# Altium footprint library Revo_connector_kisun.PcbLib: 90 footprints (part 3 of 6)
Each footprint in its own frame and in the unit in brackets; x right, y up, seen from the top. Pads: shape width x height; smd on the part's side, far side on the other; paste and mask are expansions set on the pad; w line width, h text height; cw(c..) or ccw(c..) is an arc to the next point about the centre after c.
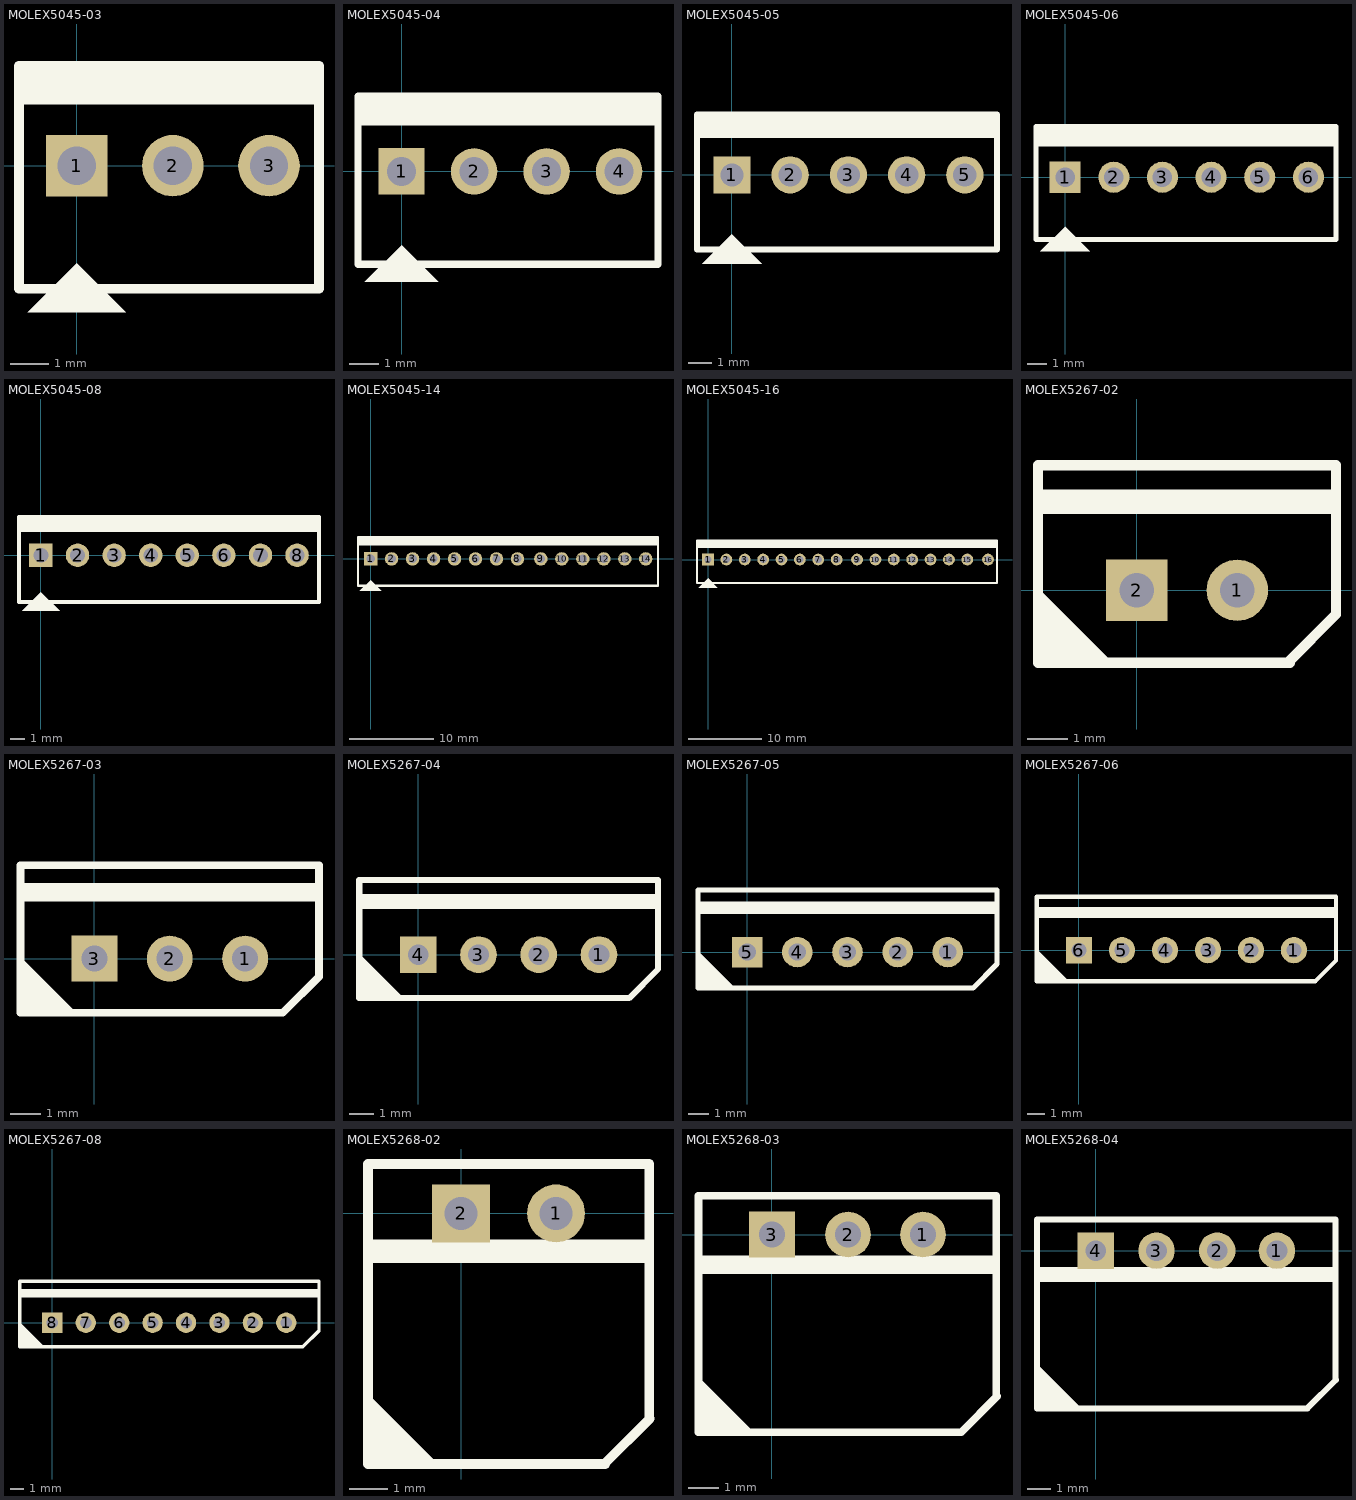
[diagram p2: the footprints below, top view; thin cyan lines are the x and y axes]

## MOLEX5045-03 [mm]
pads (3):
  rect 1.6x1.6 hole 1: 1(0,0)
  round 1.6 hole 1: 2(2.5,0) 3(5,0)
Top Overlay:
  region: 0,-2.54 -1.27,-3.81 1.27,-3.81
  region: -1.4,1.6 6.22,1.6 6.22,2.6 -1.4,2.6
  lines w0.254: -1.5,-3.2 -1.5,2.6 6.22,2.6 ; -1.48,-3.2 6.22,-3.2 ; 6.3,-3.2 6.3,2.6

## MOLEX5045-04 [mm]
pads (4):
  rect 1.6x1.6 hole 1: 1(0,0)
  round 1.6 hole 1: 2(2.5,0) 3(5,0) 4(7.5,0)
Top Overlay:
  region: 0,-2.54 -1.27,-3.81 1.27,-3.81
  region: -1.4,1.6 8.82,1.6 8.82,2.6 -1.4,2.6
  lines w0.254: -1.5,-3.2 -1.5,2.6 8.82,2.6 ; -1.48,-3.2 8.82,-3.2 ; 8.84,-3.2 8.84,2.6

## MOLEX5045-05 [mm]
pads (5):
  rect 1.6x1.6 hole 1: 1(0,0)
  round 1.6 hole 1: 2(2.5,0) 3(5,0) 4(7.5,0) 5(10,0)
Top Overlay:
  region: 0,-2.54 -1.27,-3.81 1.27,-3.81
  region: -1.4,1.6 11.32,1.6 11.32,2.6 -1.4,2.6
  lines w0.254: -1.5,-3.2 -1.5,2.6 11.32,2.6 ; -1.48,-3.2 11.32,-3.2 ; 11.38,-3.2 11.38,2.6

## MOLEX5045-06 [mm]
pads (6):
  rect 1.6x1.6 hole 1: 1(0,0)
  round 1.6 hole 1: 2(2.5,0) 3(5,0) 4(7.5,0) 5(10,0) 6(12.5,0)
Top Overlay:
  region: -1.4,1.6 13.92,1.6 13.92,2.6 -1.4,2.6
  region: 0,-2.54 -1.27,-3.81 1.27,-3.81
  lines w0.254: -1.5,-3.2 13.92,-3.2 13.92,2.6 -1.5,2.6 -1.5,-3.2

## MOLEX5045-08 [mm]
pads (8):
  rect 1.6x1.6 hole 1: 1(0,0)
  round 1.6 hole 1: 2(2.5,0) 3(5,0) 4(7.5,0) 5(10,0) 6(12.5,0) 7(15,0) 8(17.5,0)
Top Overlay:
  region: -1.4,1.6 19,1.6 19,2.6 -1.4,2.6
  region: 0,-2.54 -1.27,-3.81 1.27,-3.81
  lines w0.254: -1.5,-3.2 19,-3.2 19,2.6 -1.5,2.6 -1.5,-3.2

## MOLEX5045-14 [mm]
pads (14):
  rect 1.6x1.6 hole 1: 1(0,0)
  round 1.6 hole 1: 2(2.5,0) 3(5,0) 4(7.5,0) 5(10,0) 6(12.5,0) 7(15,0) 8(17.5,0) 9(20.28,0) 10(22.78,0) 11(25.28,0) 12(27.78,0) 13(30.28,0) 14(32.78,0)
Top Overlay:
  region: 13.84,1.6 34.24,1.6 34.24,2.6 13.84,2.6
  region: -1.4,1.6 19,1.6 19,2.6 -1.4,2.6
  region: 0,-2.54 -1.27,-3.81 1.27,-3.81
  lines w0.254: -1.5,-3.2 34.24,-3.2 34.24,2.6 -1.5,2.6 -1.5,-3.2

## MOLEX5045-16 [mm]
pads (16):
  rect 1.6x1.6 hole 1: 1(0,0)
  round 1.6 hole 1: 2(2.5,0) 3(5,0) 4(7.5,0) 5(10,0) 6(12.5,0) 7(15,0) 8(17.5,0) 9(20.28,0) 10(22.78,0) 11(25.28,0) 12(27.78,0) 13(30.28,0) 14(32.78,0) 15(35.28,0) 16(38.1,0)
Top Overlay:
  region: -1.4,1.6 19,1.6 19,2.6 -1.4,2.6
  region: 18.92,1.6 39.32,1.6 39.32,2.6 18.92,2.6
  region: 0,-2.54 -1.27,-3.81 1.27,-3.81
  lines w0.254: -1.5,-3.2 39.32,-3.2 39.32,2.6 -1.5,2.6 -1.5,-3.2

## MOLEX5267-02 [mil]
pads (2):
  round 60 hole 34: 1(98.43,0)
  rect 60x60 hole 34: 2(0,0)
Top Overlay:
  region: -94.49,-70.87 -23.62,-70.87 -94.49,0
  region: -98.43,74.8 192.91,74.8 192.91,98.43 -98.43,98.43
  lines w10: -96.46,-70.87 -96.46,122.05 192.91,122.05 ; -94.49,-70.87 149.61,-70.87 ; 147.64,-70.87 194.88,-23.62 194.88,122.05
3D body "022035025.stp": height 234.25, standoff -135.83, extent -96.45,-75.98 194.89,116.93

## MOLEX5267-03 [mil]
pads (3):
  round 60 hole 34: 1(196.85,0) 2(98.43,0)
  rect 60x60 hole 34: 3(0,0)
Top Overlay:
  region: -94.49,-70.87 -23.62,-70.87 -94.49,0
  region: -98.43,74.8 291.34,74.8 291.34,98.43 -98.43,98.43
  lines w10: -96.46,-70.87 -96.46,122.05 291.34,122.05 ; -94.49,-70.87 244.09,-70.87 ; 246.06,-70.87 293.31,-23.62 293.31,122.05
3D body "022035035.stp": height 234.25, standoff -135.83, extent -96.45,-75.98 293.32,116.93

## MOLEX5267-04 [mil]
pads (4):
  round 60 hole 34: 1(295.28,0) 2(196.85,0) 3(98.43,0)
  rect 60x60 hole 34: 4(0,0)
Top Overlay:
  region: -94.49,-70.87 -23.62,-70.87 -94.49,0
  region: -98.43,74.8 389.76,74.8 389.76,98.43 -98.43,98.43
  lines w10: -96.46,-70.87 -96.46,122.05 389.76,122.05 ; -93.7,-70.87 342.52,-70.87 ; 344.49,-70.87 391.73,-23.62 391.73,122.05
3D body "022035045.stp": height 234.25, standoff -135.83, extent -96.46,-66.14 391.73,126.77

## MOLEX5267-05 [mil]
pads (5):
  round 60 hole 34: 1(393.7,0) 2(295.28,0) 3(196.85,0) 4(98.43,0)
  rect 60x60 hole 34: 5(0,0)
Top Overlay:
  region: -94.49,-70.87 -23.62,-70.87 -94.49,0
  region: -98.43,74.8 488.19,74.8 488.19,98.43 -98.43,98.43
  lines w10: -96.46,-70.87 -96.46,122.05 488.19,122.05 ; -93.7,-70.87 440.94,-70.87 ; 442.91,-70.87 490.16,-23.62 490.16,122.05
3D body "022035055.stp": height 234.25, standoff -135.83, extent -96.46,-68.9 490.16,124.02

## MOLEX5267-06 [mil]
pads (6):
  round 60 hole 34: 1(492.13,0) 2(393.7,0) 3(295.28,0) 4(196.85,0) 5(98.43,0)
  rect 60x60 hole 34: 6(0,0)
Top Overlay:
  region: -94.49,-70.87 -23.62,-70.87 -94.49,0
  region: -98.43,74.8 586.61,74.8 586.61,98.43 -98.43,98.43
  lines w10: -96.46,-70.87 -96.46,122.05 586.61,122.05 ; -93.7,-70.87 539.37,-70.87 ; 541.34,-70.87 588.58,-23.62 588.58,122.05
3D body "022035065.stp": height 234.25, standoff -135.83, extent -96.46,-71.07 588.58,121.85

## MOLEX5267-08 [mil]
pads (8):
  round 60 hole 34: 1(688.98,0) 2(590.55,0) 3(492.13,0) 4(393.7,0) 5(295.28,0) 6(196.85,0) 7(98.43,0)
  rect 60x60 hole 34: 8(0,0)
Top Overlay:
  region: -94.49,-70.87 -23.62,-70.87 -94.49,0
  region: -98.43,74.8 783.46,74.8 783.46,98.43 -98.43,98.43
  lines w10: -96.46,-70.87 -96.46,122.05 785.43,122.05 785.43,-23.62 738.19,-70.87 -96.46,-70.87
3D body "022035085.stp": height 234.25, standoff -135.83, extent -98.43,-66.93 783.46,125.99

## MOLEX5268-02 [mil]
pads (2):
  round 60 hole 34: 1(98.43,0)
  rect 60x60 hole 34: 2(0,0)
Top Overlay:
  region: -94.49,-259.84 -23.62,-259.84 -94.49,-188.98
  region: -98.43,-51.18 192.91,-51.18 192.91,-27.56 -98.43,-27.56
  lines w10: -96.46,-259.84 -96.46,51.18 192.91,51.18 ; -94.49,-259.84 149.61,-259.84 ; 148.43,-259.84 195.67,-212.6 ; 194.88,-212.6 194.88,51.18

## MOLEX5268-03 [mil]
pads (3):
  round 60 hole 34: 1(198.43,0) 2(100,0)
  rect 60x60 hole 34: 3(0,0)
Top Overlay:
  region: -94.49,-259.84 -23.62,-259.84 -94.49,-188.98
  region: 1.57,-51.18 292.91,-51.18 292.91,-27.56 1.57,-27.56
  region: -98.43,-51.18 192.91,-51.18 192.91,-27.56 -98.43,-27.56
  lines w10: -96.46,-259.84 -96.46,51.18 294.88,51.18 294.88,-212.6 ; -94.49,-259.84 248.43,-259.84 295.67,-212.6
3D body "22057035.stp": height 194.88, standoff -135.83, extent -97.64,-260.63 292.13,50.4

## MOLEX5268-04 [mil]
pads (4):
  round 60 hole 34: 1(298.43,0) 2(200,0) 3(100,0)
  rect 60x60 hole 34: 4(0,0)
Top Overlay:
  region: -94.49,-259.84 -23.62,-259.84 -94.49,-188.98
  region: -98.43,-51.18 192.91,-51.18 192.91,-27.56 -98.43,-27.56
  region: 101.57,-51.18 392.91,-51.18 392.91,-27.56 101.57,-27.56
  lines w10: -96.46,-259.84 -96.46,51.18 394.88,51.18 394.88,-212.6 ; -94.49,-259.84 348.43,-259.84 395.67,-212.6
3D body "022057045.stp": height 194.88, standoff -135.83, extent -96.46,-258.86 391.73,52.16